# Altium footprint library KwantLib.PcbLib: 249 footprints (part 16 of 16)
Each footprint in its own frame and in the unit in brackets; x right, y up, seen from the top. Pads: shape width x height; smd on the part's side, far side on the other; paste and mask are expansions set on the pad; w line width, h text height; cw(c..) or ccw(c..) is an arc to the next point about the centre after c.
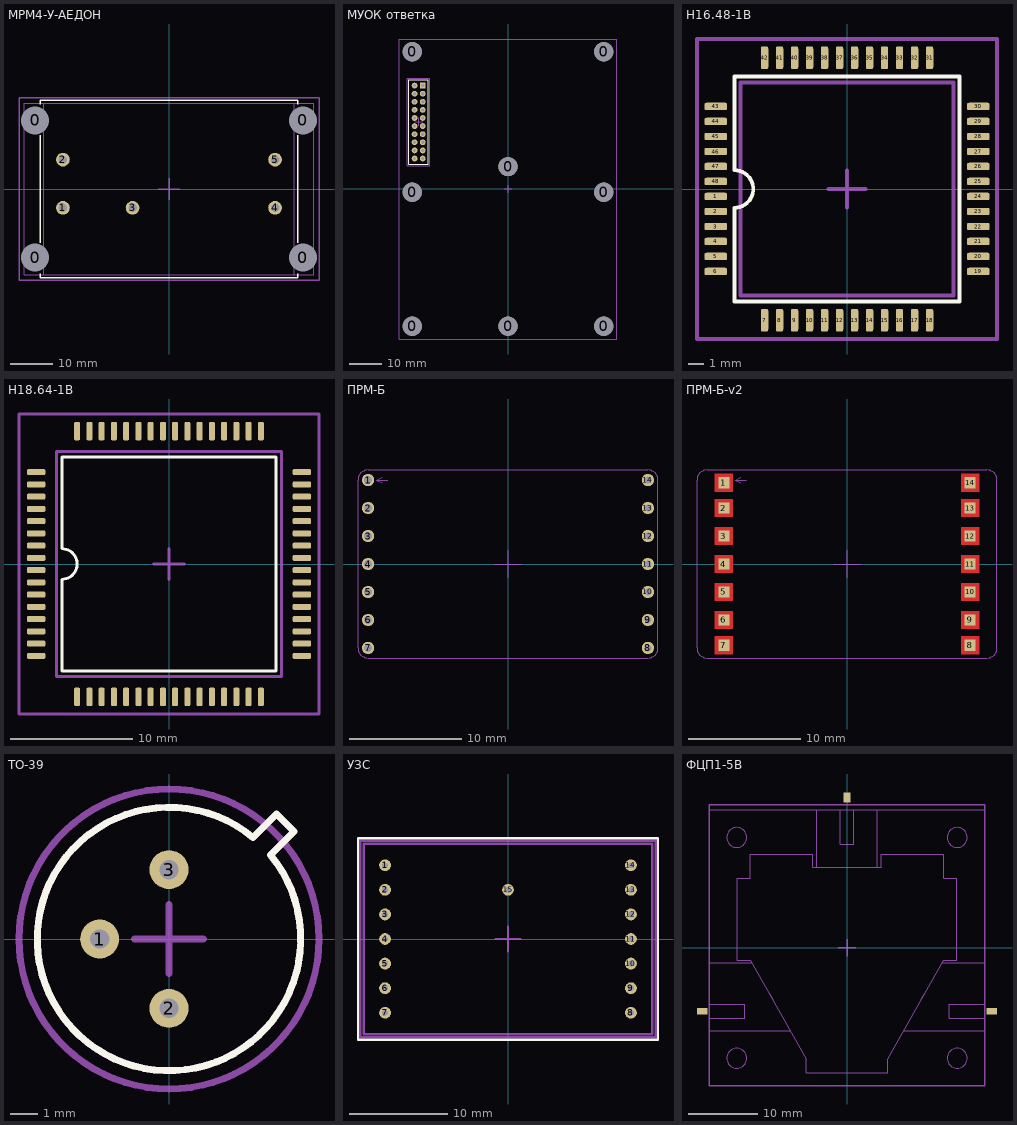
[diagram p15: the footprints below, top view; thin cyan lines are the x and y axes]

## МРМ4-У-АЕДОН [mm]
height 10
pads (9):
  round 5 hole 6.5 unplated: 0(-31.25,-16) 0(-31.25,16) 0(31.25,-16) 0(31.25,16)
  round 3.2 hole 2: 1(-24.75,-4.4) 2(-24.75,6.85) 3(-8.5,-4.4) 4(24.75,-4.4) 5(24.75,6.85)
Top Overlay:
  lines w0.3: -30,-19.75 -30,-20.75 30,-20.75 30,-19.75 ; -30,-12.5 -30,12.5 ; -30,19.75 -30,20.75 30,20.75 30,19.75 ; 30,-12.5 30,12.5
Mechanical 1:
  circle w0.1: c24.75,6.85 r0.5
  circle w0.1: c24.75,-4.4 r0.5
  circle w0.1: c-8.5,-4.4 r0.5
  circle w0.1: c-24.75,-4.4 r0.5
  circle w0.1: c-24.75,6.85 r0.5
Mechanical 13:
  circle w0.2: c-31.25,-16 r1.35
  circle w0.2: c-31.25,16 r1.35
  circle w0.2: c31.25,-16 r1.35
  circle w0.2: c31.25,16 r1.35
  lines w0.1: -33,-16 -29.5,-16 ; -33,16 -29.5,16 ; -31.25,-17.75 -31.25,-14.25 ; -31.25,14.25 -31.25,17.75 ; 29.5,-16 33,-16 ; 29.5,16 33,16 ; 31.25,-17.75 31.25,-14.25 ; 31.25,14.25 31.25,17.75
  lines w0.2: -29.25,-20 -33.75,-20 -33.75,20 -29.25,20 ; -29.25,-20 -29.25,20 ; -29.25,-20 29.25,-20 ; -29.25,20 29.25,20 ; 29.25,-20 33.75,-20 33.75,20 29.25,20 ; 29.25,-20 29.25,20
Mechanical 15:
  lines w0.3: -35,-21.25 35,-21.25 35,21.25 -35,21.25 -35,-21.25
  lines w0.35: -2.5,0 2.5,0 ; 0,-2.5 0,2.5
3D body "Фильтр помехоподавляющий МРМ4-В20ДМУ _ БКЯЮ.468829.005ТУ.stp": height 10, standoff -2.5, extent -33.75,-20.1 33.75,20.1

## МУОК ответка [mm]
pads (28):
  round 6 hole 6 unplated: 0(-30,-43) 0(-30,-1) 0(-30,43) 0(0,-43) 0(0,7) 0(30,-43) 0(30,-1) 0(30,43)
  rect 1.8x1.8 hole 1: 1(-26.73,32.41)
  round 1.8 hole 1: 2(-29.27,32.41) 3(-26.73,29.87) 4(-29.27,29.87) 5(-26.73,27.33) 6(-29.27,27.33) 7(-26.73,24.79) 8(-29.27,24.79) 9(-26.73,22.25) 10(-29.27,22.25) 11(-26.73,19.71) 12(-29.27,19.71) 13(-26.73,17.17) 14(-29.27,17.17) 15(-26.73,14.63) 16(-29.27,14.63) 17(-26.73,12.09) 18(-29.27,12.09) 19(-26.73,9.55) 20(-29.27,9.55)
Top Overlay:
  lines w0.25: -31.048,7.792 -24.952,7.792 -24.952,34.208 -31.048,34.208 -31.048,7.792
Mechanical 13:
  lines w0.25: -34,-47 -34,47 34,47 34,-47 -34,-47
Mechanical 15:
  lines w0.25: -29.25,21 -26.75,21 ; -28,19.75 -28,22.25 ; -1.25,0 1.25,0 ; 0,-1.25 0,1.25 ; -31.556,7.284 -24.444,7.284 -24.444,34.716 -31.556,34.716 -31.556,7.284
3D body "PBD2_54-20.step": height 8.4, standoff -2.7, extent -30.58,8.3 -25.5,33.7
3D body "МУОК.step": height 26, standoff 2.9, extent -34,-47 34,47

## Н16.48-1В [mm]
height 3
pads (48):
  rrect50% 1.5x0.5 smd: 1(-8.75,-0.5) 2(-8.75,-1.5) 3(-8.75,-2.5) 4(-8.75,-3.5) 5(-8.75,-4.5) 6(-8.75,-5.5) 19(8.75,-5.5) 20(8.75,-4.5) 21(8.75,-3.5) 22(8.75,-2.5) 23(8.75,-1.5) 24(8.75,-0.5) 25(8.75,0.5) 26(8.75,1.5) 27(8.75,2.5) 28(8.75,3.5) 29(8.75,4.5) 30(8.75,5.5) 43(-8.75,5.5) 44(-8.75,4.5) 45(-8.75,3.5) 46(-8.75,2.5) 47(-8.75,1.5) 48(-8.75,0.5)
  rrect50% 0.5x1.5 smd: 7(-5.5,-8.75) 8(-4.5,-8.75) 9(-3.5,-8.75) 10(-2.5,-8.75) 11(-1.5,-8.75) 12(-0.5,-8.75) 13(0.5,-8.75) 14(1.5,-8.75) 15(2.5,-8.75) 16(3.5,-8.75) 17(4.5,-8.75) 18(5.5,-8.75) 31(5.5,8.75) 32(4.5,8.75) 33(3.5,8.75) 34(2.5,8.75) 35(1.5,8.75) 36(0.5,8.75) 37(-0.5,8.75) 38(-1.5,8.75) 39(-2.5,8.75) 40(-3.5,8.75) 41(-4.5,8.75) 42(-5.5,8.75)
Top Overlay:
  lines w0.25: -7.5,-7.5 -7.5,-1.25 ccw(c-7.5,0) -7.5,1.25 -7.5,7.5 7.5,7.5 7.5,-7.5 -7.5,-7.5
Mechanical 13:
  lines w0.25: -7.1,-7.1 7.1,-7.1 7.1,7.1 -7.1,7.1 -7.1,-7.1
Mechanical 15:
  lines w0.25: -1.25,0 1.25,0 ; 0,-1.25 0,1.25 ; -10,-10 10,-10 10,10 -10,10 -10,-10
3D body: height 3, standoff 0.01, extent -7.1,-7.1 7.1,7.1

## Н18.64-1В [mm]
height 3
pads (64):
  rrect50% 1.5x0.5 smd: 1(-10.85,-0.5) 2(-10.85,-1.5) 3(-10.85,-2.5) 4(-10.85,-3.5) 5(-10.85,-4.5) 6(-10.85,-5.5) 7(-10.85,-6.5) 8(-10.85,-7.5) 25(10.85,-7.5) 26(10.85,-6.5) 27(10.85,-5.5) 28(10.85,-4.5) 29(10.85,-3.5) 30(10.85,-2.5) 31(10.85,-1.5) 32(10.85,-0.5) 33(10.85,0.5) 34(10.85,1.5) 35(10.85,2.5) 36(10.85,3.5) 37(10.85,4.5) 38(10.85,5.5) 39(10.85,6.5) 40(10.85,7.5) 57(-10.85,7.5) 58(-10.85,6.5) 59(-10.85,5.5) 60(-10.85,4.5) 61(-10.85,3.5) 62(-10.85,2.5) 63(-10.85,1.5) 64(-10.85,0.5)
  rrect50% 0.5x1.5 smd: 9(-7.5,-10.85) 10(-6.5,-10.85) 11(-5.5,-10.85) 12(-4.5,-10.85) 13(-3.5,-10.85) 14(-2.5,-10.85) 15(-1.5,-10.85) 16(-0.5,-10.85) 17(0.5,-10.85) 18(1.5,-10.85) 19(2.5,-10.85) 20(3.5,-10.85) 21(4.5,-10.85) 22(5.5,-10.85) 23(6.5,-10.85) 24(7.5,-10.85) 41(7.5,10.85) 42(6.5,10.85) 43(5.5,10.85) 44(4.5,10.85) 45(3.5,10.85) 46(2.5,10.85) 47(1.5,10.85) 48(0.5,10.85) 49(-0.5,10.85) 50(-1.5,10.85) 51(-2.5,10.85) 52(-3.5,10.85) 53(-4.5,10.85) 54(-5.5,10.85) 55(-6.5,10.85) 56(-7.5,10.85)
Top Overlay:
  lines w0.25: -8.75,-8.75 -8.75,-1.25 ccw(c-8.75,0) -8.75,1.25 -8.75,8.75 8.75,8.75 8.75,-8.75 -8.75,-8.75
Mechanical 13:
  lines w0.25: -9.2,-9.2 9.2,-9.2 9.2,9.2 -9.2,9.2 -9.2,-9.2
Mechanical 15:
  lines w0.25: -1.25,0 1.25,0 ; 0,-1.25 0,1.25 ; -12.25,-12.25 12.25,-12.25 12.25,12.25 -12.25,12.25 -12.25,-12.25
3D body "Н18.64-1В_1.x_t": height 3.33, standoff 0.48, extent -12.5,-13 13,12.5

## ПРМ-Б [mm]
pads (14):
  round 1.1 hole 0.7 mask+0.07: 1(-12.5,7.5) 2(-12.5,5) 3(-12.5,2.5) 4(-12.5,0) 5(-12.5,-2.5) 6(-12.5,-5) 7(-12.5,-7.5)
  round 1.1 hole 0.6 mask+0.07: 8(12.5,-7.5) 9(12.5,-5) 10(12.5,-2.5) 11(12.5,0) 12(12.5,2.5) 13(12.5,5) 14(12.5,7.5)
Mechanical 16:
  lines w0.1: -11.25,7.25 -11.75,7.5 ; -11.25,7.75 -11.75,7.5 ; -10.75,7.5 -11.75,7.5 ; -1.25,0 1.25,0 ; 0,-1.25 0,1.25 ; -13.4,-7.5 ccw(c-12.5,-7.5) -12.5,-8.4 12.5,-8.4 ccw(c12.5,-7.5) 13.4,-7.5 13.4,7.5 ccw(c12.5,7.5) 12.5,8.4 -12.5,8.4 ccw(c-12.5,7.5) -13.4,7.5 -13.4,-7.5
3D body "155.15-2 Корпус_ЛСК.stp": height 3.8, standoff -1.8, extent -14.675,-9.675 14.675,9.675

## ПРМ-Б-v2 [mm]
pads (14):
  rect 1x1 smd paste-1 mask+0.07: 1(-11,7.25) 2(-11,5) 3(-11,2.5) 4(-11,0) 5(-11,-2.5) 6(-11,-5) 7(-11,-7.25) 8(11,-7.25) 9(11,-5) 10(11,-2.5) 11(11,0) 12(11,2.5) 13(11,5) 14(11,7.25)
Top Layer:
  pour cut-out: 10.2,-8.05 10.2,-6.45 11.8,-6.45 11.8,-8.05
  pour cut-out: 10.2,-5.8 10.2,-4.2 11.8,-4.2 11.8,-5.8
  pour cut-out: 10.2,-3.3 10.2,-1.7 11.8,-1.7 11.8,-3.3
  pour cut-out: 10.2,-0.8 10.2,0.8 11.8,0.8 11.8,-0.8
  pour cut-out: 10.2,1.7 10.2,3.3 11.8,3.3 11.8,1.7
  pour cut-out: 10.2,4.2 10.2,5.8 11.8,5.8 11.8,4.2
  pour cut-out: 10.2,6.45 10.2,8.05 11.8,8.05 11.8,6.45
  pour cut-out: -11.8,6.45 -11.8,8.05 -10.2,8.05 -10.2,6.45
  pour cut-out: -11.8,4.2 -11.8,5.8 -10.2,5.8 -10.2,4.2
  pour cut-out: -11.8,1.7 -11.8,3.3 -10.2,3.3 -10.2,1.7
  pour cut-out: -11.8,-0.8 -11.8,0.8 -10.2,0.8 -10.2,-0.8
  pour cut-out: -11.8,-3.3 -11.8,-1.7 -10.2,-1.7 -10.2,-3.3
  pour cut-out: -11.8,-5.8 -11.8,-4.2 -10.2,-4.2 -10.2,-5.8
  pour cut-out: -11.8,-8.05 -11.8,-6.45 -10.2,-6.45 -10.2,-8.05
Mechanical 16:
  lines w0.1: -9.5,7.25 -10,7.5 ; -9.5,7.75 -10,7.5 ; -9,7.5 -10,7.5 ; -1.25,0 1.25,0 ; 0,-1.25 0,1.25 ; -13.4,-7.5 ccw(c-12.5,-7.5) -12.5,-8.4 12.5,-8.4 ccw(c12.5,-7.5) 13.4,-7.5 13.4,7.5 ccw(c12.5,7.5) 12.5,8.4 -12.5,8.4 ccw(c-12.5,7.5) -13.4,7.5 -13.4,-7.5
3D body "155.15-2 с гвоздиком.stp": height 3.2, standoff -0.6, extent -14.675,-9.675 14.675,9.675

## ТО-39 [mm] "Транзистор"
pads (3):
  round 1.4 hole 0.7 unplated: 1(-2.5,0) 2(0,-2.5) 3(0,2.5)
Top Overlay:
  lines w0.25: 3.032,3.657 ccw(c0,0) 3.657,3.032 4.5,3.875 3.875,4.5 3.032,3.657
Mechanical 13:
  lines w0.25: 3.032,3.657 ccw(c0,0) 3.657,3.032 4.5,3.875 3.875,4.5 3.032,3.657
Mechanical 15:
  circle w0.25: c0,0 r5.408
  lines w0.25: -1.25,0 1.25,0 ; 0,-1.25 0,1.25
3D body: height 9.6, standoff 3, extent -4.75,-4.749 4.75,4.749

## УЗС [mm] "Корпус УЗС"
pads (15):
  round 1.2 hole 0.6: 1(-12.5,7.5) 2(-12.5,5) 3(-12.5,2.5) 4(-12.5,0) 5(-12.5,-2.5) 6(-12.5,-5) 7(-12.5,-7.5) 8(12.5,-7.5) 9(12.5,-5) 10(12.5,-2.5) 11(12.5,0) 12(12.5,2.5) 13(12.5,5) 14(12.5,7.5) 15(0,5)
Top Overlay:
  lines w0.254: -15.25,-10.25 -15.25,10.25 15.25,10.25 15.25,-10.25 -15.25,-10.25
Mechanical 13:
  lines w0.254: -14.675,-9.675 14.675,-9.675 14.675,9.675 -14.675,9.675 -14.675,-9.675
Mechanical 15:
  lines w0.254: -1.25,0 1.25,0 ; 0,-1.25 0,1.25 ; -15,-10 15,-10 15,10 -15,10 -15,-10
3D body "УЗС-Б.step": height 5.2, standoff -2.2, extent -14.675,-9.675 14.675,9.675

## ФЦП1-5В [mm] "Циркулфтор ФЦП1-5В"
pads (3):
  rect 1.5x1 smd: 1(-21,-9.2) 2(21,-9.2)
  rect 1x1.5 smd: 3(0,21.8)
Mechanical 13:
  circle w0.1: c16,16 r1.45
  circle w0.1: c16,-16 r1.45
  circle w0.1: c-16,-16 r1.45
  circle w0.1: c-16,16 r1.45
  lines w0.1: -13.791,-2.2 -20,-2.2 ; -11.211,-6.76 ccw(c0,-0.9) -10.797,-7.491 ; -8.246,-12 -20,-12 ; -4.4,11.67 -4.4,20 ; 4.4,11.67 4.4,20 ; 8.246,-12 20,-12 ; 10.797,-7.491 ccw(c0,-0.9) 11.211,-6.76 ; 13.791,-2.2 20,-2.2 ; -20,-12 -20,-20 20,-20 20,-12 ; -20,-12 -20,-10.2 ; -20,-10.2 -14.823,-10.2 -14.823,-8.2 -20,-8.2 ; -20,-10.2 -20,-8.2 ; -20,-8.2 -20,-2.2 ; -20,-2.2 -20,20 -4.4,20 ; -4.4,20 -1,20 ; -1,20 -1,15 1,15 1,20 ; -1,20 1,20 ; 1,20 4.4,20 ; 4.4,20 20,20 20,-2.2 ; 20,-12 20,-10.2 ; 20,-10.2 14.823,-10.2 14.823,-8.2 20,-8.2 ; 20,-10.2 20,-8.2 ; 20,-8.2 20,-2.2 ; -15.9,-1.83 -14,-1.83 -5.875,-16.191 -5.875,-18.091 5.875,-18.091 5.875,-16.191 14,-1.83 15.9,-1.83 15.9,10.07 14,10.07 14,11.67 14,13.57 5,13.57 5,11.67 -5,11.67 -5,13.57 -14,13.57 -14,11.67 -14,10.07 -15.9,10.07 -15.9,-1.83
Mechanical 15:
  lines w0.2: -1.25,0 1.25,0 ; 0,-1.25 0,1.25 ; -20,-20 -20,20.75 20,20.75 20,-20 -20,-20
3D body "ФЦП1-5В.stp": height 9.5, standoff -4, extent -20,-20 20,20